# Altium footprint library common.PcbLib: 552 footprints (part 7 of 35)
Each footprint in its own frame and in the unit in brackets; x right, y up, seen from the top. Pads: shape width x height; smd on the part's side, far side on the other; paste and mask are expansions set on the pad; w line width, h text height; cw(c..) or ccw(c..) is an arc to the next point about the centre after c.
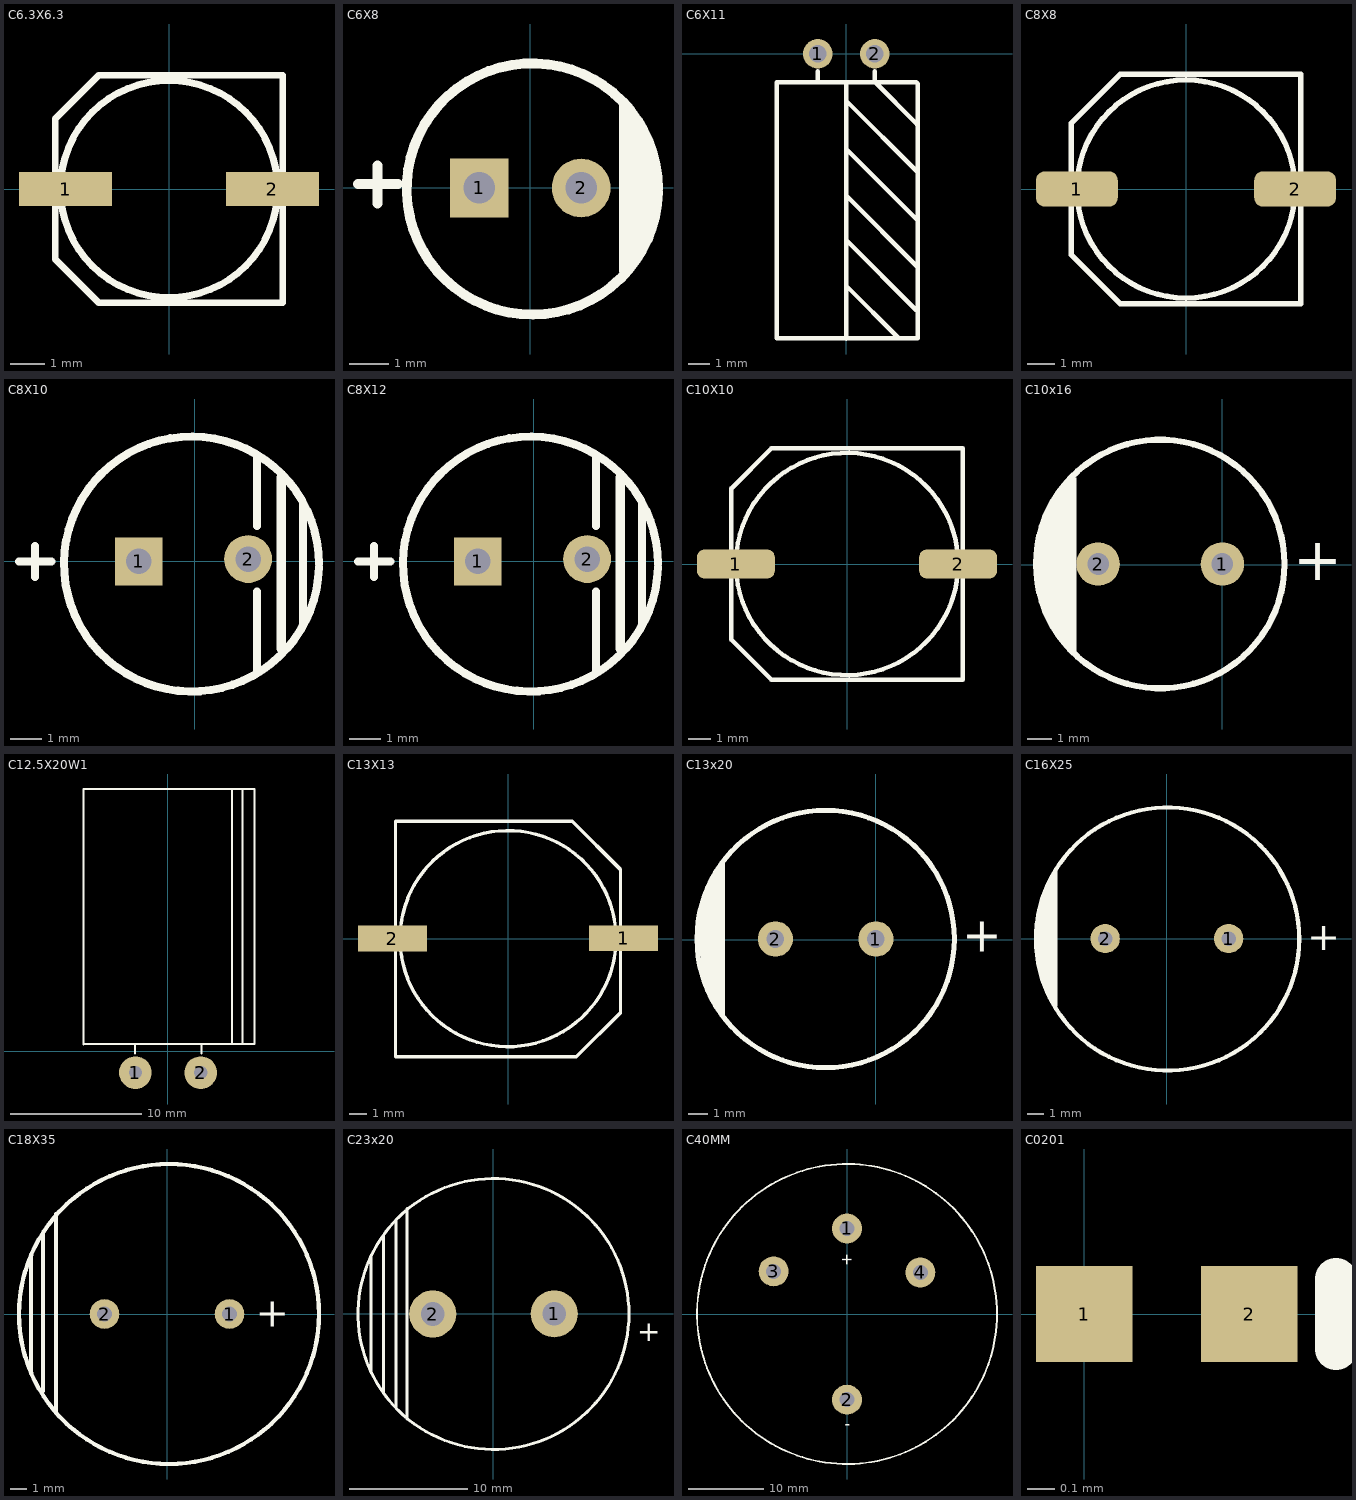
[diagram p6: the footprints below, top view; thin cyan lines are the x and y axes]

## C6.3X6.3 [mm]
height 5.5
pads (2):
  rect 2.7x1 smd: 1(-3,0) 2(3,0)
Top Overlay:
  circle w0.2: c0,0 r3.15
  lines w0.2: -3.3,2.032 -3.3,-2.032 -2.032,-3.3 3.3,-3.3 3.3,3.3 -2.032,3.3 -3.287,2.045
3D body: height 5.2, standoff 0, extent -3.5,-3.302 3.5,3.298

## C6X8 [mm]
pads (2):
  rect 1.5x1.5 hole 0.8: 1(-1.3,0)
  round 1.5 hole 0.8: 2(1.3,0)
Top Overlay:
  lines w0.254: -4.4,0.1 -3.384,0.1 ; -3.9,-0.4 -3.9,0.567 ; 2.388,-2.108 2.388,2.159 ; 3.261,-0.116 cw(c0.052,-0.028) 3.262,-0.025
  lines w0.3: 2.642,-1.88 2.642,1.778
  lines w0.5: 2.896,-1.245 2.896,1.168
3D body: height 7.53, standoff -3.01, extent -3.15,-3.201 3.201,3.15

## C6X11 [mm]
height 1.524
pads (2):
  round 1.35 hole 0.8: 1(-1.3,0) 2(1.3,0)
Top Overlay:
  lines w0.203: -1.3,-1.3 -1.3,-0.8 ; 0,-13.005 0,-1.3 ; 0.005,-10.587 2.363,-12.953 ; 0.005,-8.504 3.187,-11.697 ; 0.005,-6.472 3.206,-9.684 ; 0.006,-2.153 3.252,-5.408 ; 0.049,-4.396 3.201,-7.546 ; 1.291,-1.279 3.218,-3.208 ; 1.3,-1.3 1.3,-0.8 ; 3.252,-5.408 3.252,-1.36 3.191,-1.3 -3.176,-1.3 cw(c-3.183,-1.307) -3.173,-1.307 -3.173,-12.979 3.252,-12.979 3.252,-5.408
3D body: height 6.35, standoff -2.83, extent -3.125,-12.965 3.226,0.356

## C8X8 [mm]
height 10
pads (2):
  rrect50% 3x1.3 smd: 1(-4,0) 2(4,0)
Top Overlay:
  circle w0.2: c0,0 r4
  lines w0.2: -4.2,-2.413 -2.413,-4.2 4.2,-4.2 4.2,4.2 -2.413,4.2 -4.2,2.413 -4.2,-2.413
3D body: height 10.5, standoff 0, extent -4.521,-4.216 4.479,4.084

## C8X10 [mm]
pads (2):
  rect 1.5x1.5 hole 0.8: 1(-1.753,-0.013)
  round 1.5 hole 0.8: 2(1.676,0.064)
Top Overlay:
  lines w0.254: -5.512,-0.013 -4.496,-0.013 ; -5.004,-0.495 -5.004,0.472 ; 1.956,-3.467 1.956,-0.953 ; 1.956,1.105 1.956,3.238 ; 3.404,-1.994 3.404,1.816 ; 3.898,-0.201 cw(c-0.1,-0.091) 3.9,-0.088
  lines w0.3: 2.718,-2.756 2.718,2.629
3D body: height 11.74, standoff -18.75, extent -4.102,-4 3.898,4

## C8X12 [mm]
pads (2):
  rect 1.5x1.5 hole 0.8: 1(-1.753,-0.013)
  round 1.5 hole 0.8: 2(1.676,0.064)
Top Overlay:
  lines w0.254: -5.512,-0.013 -4.496,-0.013 ; -5.004,-0.495 -5.004,0.472 ; 1.956,-3.467 1.956,-0.953 ; 1.956,1.105 1.956,3.238 ; 3.404,-1.994 3.404,1.816 ; 3.898,-0.201 cw(c-0.1,-0.091) 3.9,-0.088
  lines w0.3: 2.718,-2.756 2.718,2.629
3D body: height 11.74, standoff -18.75, extent -4.102,-4 3.898,4

## C10X10 [mm]
height 10
pads (2):
  rrect50% 3.5x1.3 smd: 1(-5,0) 2(5,0)
Top Overlay:
  circle w0.2: c0,0 r5
  lines w0.2: -5.2,3.404 -5.2,-3.404 -3.404,-5.2 5.2,-5.2 5.2,5.2 -3.404,5.2 -5.191,3.413
3D body: height 10.21, standoff -0.01, extent -5.775,-5.118 5.825,5.182

## C10x16 [mil] "RB.2/.4"
pads (2):
  round 70 hole 35: 1(0,1) 2(-200,1)
Top Overlay:
  circle w10: c-100,1 r200
  rectangle: -250,-140 -235,140
  rectangle: -270,-110 -245,115
  rectangle: -285,-80 -260,90
  rectangle: -295,-60 -265,55
  lines w11.81: -245,130 ccw(c-105.35,2.7) -241.45,-128.39
  text "+" at 114,-25 h68.9
3D body: height 708.66, standoff -669.29, extent -296.85,-197.7 96.85,196

## C12.5X20W1 [mm]
pads (2):
  round 2.5 hole 1: 1(-2.49,-1.63) 2(2.508,-1.631)
Top Overlay:
  lines w0.152: -6.474,0.546 6.593,0.546 6.635,0.588 6.635,20.079 -6.471,20.079 -6.471,0.521 ; -2.527,-0.164 -2.527,0.519 ; 2.577,-0.175 2.577,0.514 ; 4.891,0.566 4.891,20.004 ; 5.724,0.575 5.724,20.074
3D body: height 13.07, standoff -2.14, extent -6.474,-1.939 6.577,20.05

## C13X13 [mm]
pads (2):
  rect 4x1.5 smd: 1(6.706,0.025) 2(-6.706,0)
Top Overlay:
  circle w0.2: c0,0 r6.271
  lines w0.2: -6.528,-6.85 -6.528,6.807 3.734,6.807 6.528,4.013 6.528,-4.293 3.971,-6.85 -6.528,-6.85
3D body: height 13.8, standoff -0.2, extent -7.5,-6.85 7.501,6.85

## C13x20 [mil] "RB.2/.5"
pads (2):
  round 70 hole 35: 1(0,1) 2(-200,1)
Top Overlay:
  circle w10: c-100,1 r255.91
  rectangle: -332,-114 -314,121
  rectangle: -323,-132 -309,135
  rectangle: -312,-149 -300,152
  lines w10: -349,-29 -349,45 ; -343,-68 -343,72 ; -336,-97 -336,96
  text "+" at 172,-24 h68.9
3D body: height 786.92, standoff -748.03, extent -348.13,-245.13 144,247

## C16X25 [mil]
pads (2):
  round 70 hole 35: 1(147.64,0) 2(-147.64,0)
Top Overlay:
  circle w10: c1.64,-1 r314.96
  rectangle: -274.36,-161 -262.36,161
  rectangle: -285.36,-143 -270.36,140
  rectangle: -294.36,-117 -276.36,118
  lines w10: -311.36,-27 -311.36,35 ; -305.36,-66 -305.36,69 ; -298.36,-95 -298.36,93
  text "+" at 335.64,-28 h68.9
3D body: height 984.25, standoff -748.03, extent -312.96,-317 316.96,312.92

## C18X35 [mil]
height 35.43
pads (2):
  round 70 hole 35: 1(147.64,0) 2(-147.64,0)
Top Overlay:
  circle w10: c4.67,0 r354.33
  lines w10: -321,-137 -321,137 ; -293,-182 -293,190 ; -262,-231 -262,236
  text "+" at 210,-30 h68.9
3D body: height 1476.38, standoff -118.11, extent -358.05,-360.23 368.05,365

## C23x20 [mm] "RB.2/.5"
pads (2):
  round 4 hole 2: 1(5.156,0) 2(-5.156,-0.013)
Top Overlay:
  circle w0.254: c0,-0.013 r11.5
  lines w0.254: -10.389,-4.928 -10.389,4.928 ; -9.322,-6.756 -9.322,6.706 ; -8.255,-7.95 -8.255,8.001 ; -7.341,-8.915 -7.341,8.941
  text "+" at 12.217,-2.311 h1.75
3D body: height 25, standoff 0, extent -10.899,-11.026 11.101,10.975

## C40MM [mm]
pads (4):
  round 4 hole 2: 1(0,11.417) 2(0,-11.417) 3(-9.779,5.702) 4(9.779,5.55)
Top Overlay:
  circle w0.254: c0,0.013 r20
  text "-" at -0.279,-15.342 h1.52
  text "+" at -0.635,8.128 h1.52
3D body: height 80, standoff -9.9, extent -19.975,-20.038 20.025,19.913

## C0201 [mm]
pads (2):
  rect 0.35x0.35 smd: 1(0,0) 2(0.6,0)
Top Overlay:
  lines w0.152: 0.914,-0.127 0.914,0.127
3D body: height 0.28, standoff -0.02, extent 0,-0.15 0.6,0.15